# Altium footprint library Connectors.PcbLib: 408 footprints (part 4 of 26)
Each footprint in its own frame and in the unit in brackets; x right, y up, seen from the top. Pads: shape width x height; smd on the part's side, far side on the other; paste and mask are expansions set on the pad; w line width, h text height; cw(c..) or ccw(c..) is an arc to the next point about the centre after c.
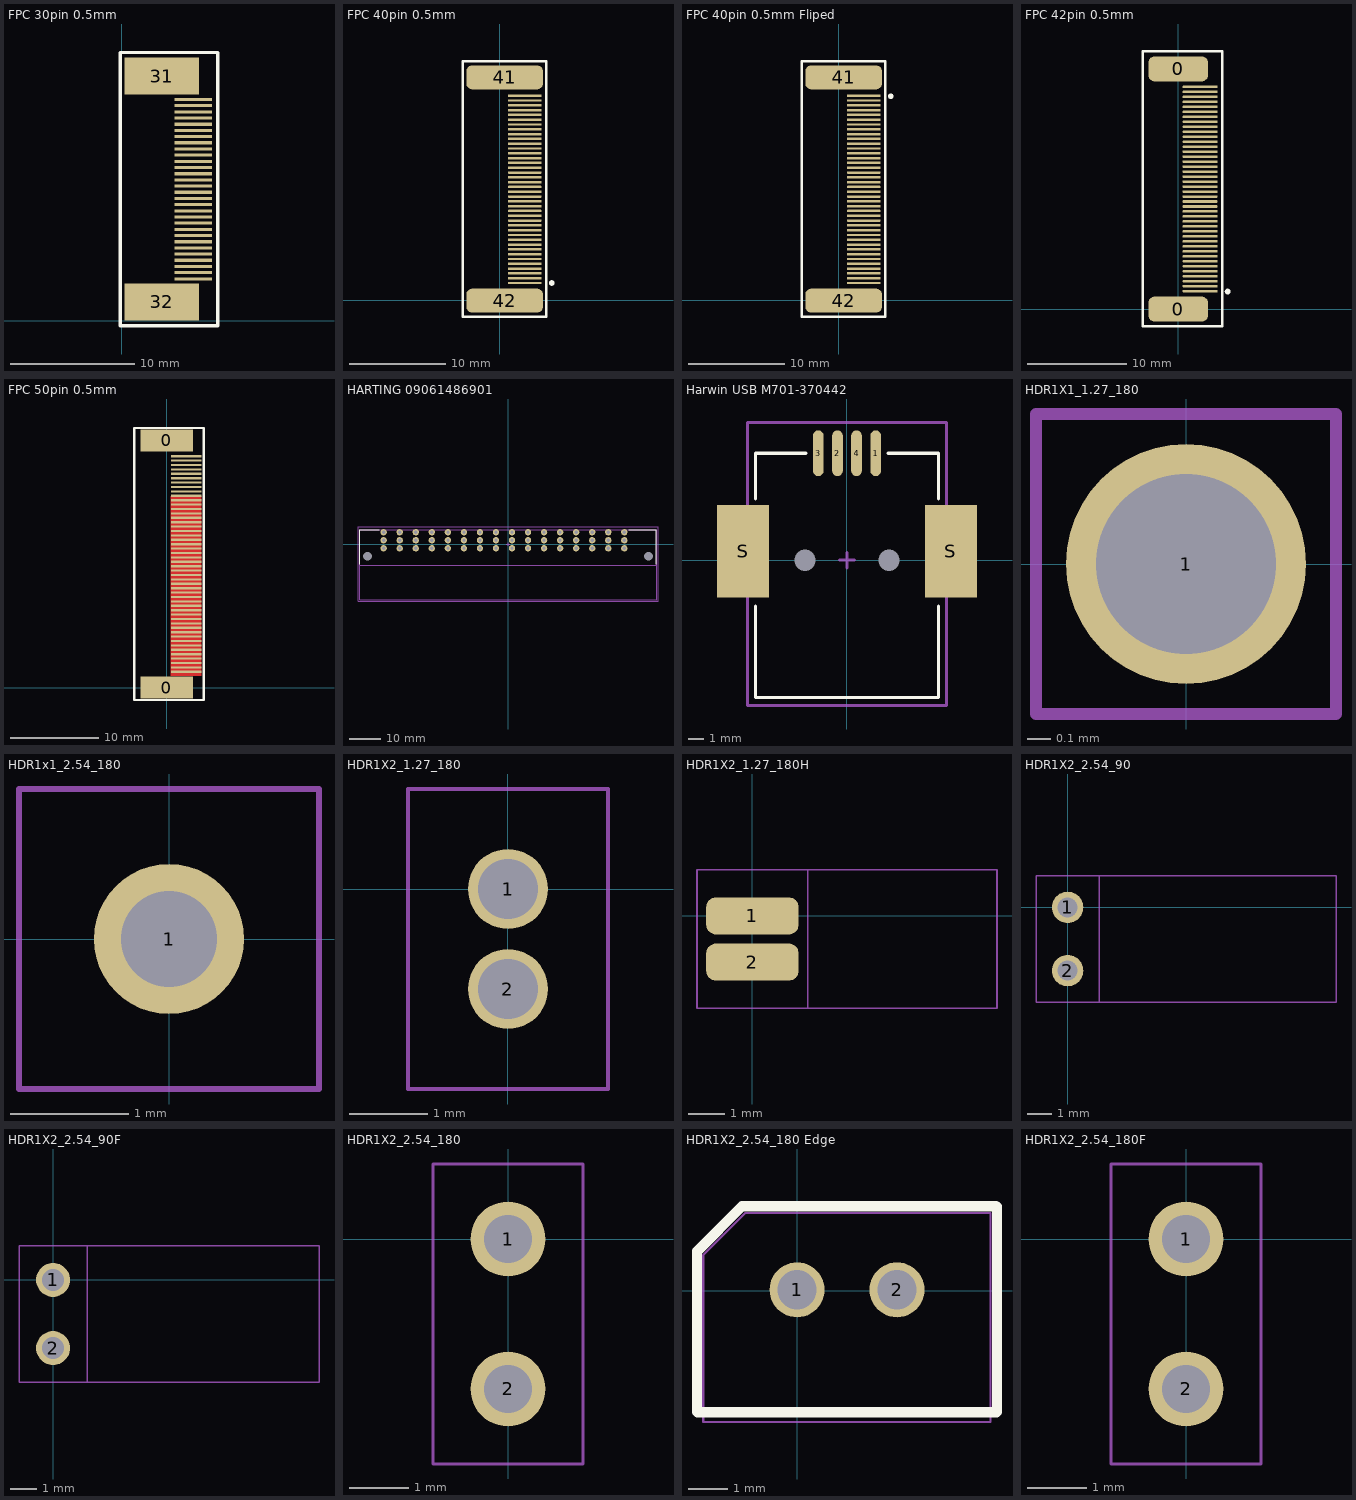
[diagram p3: the footprints below, top view; thin cyan lines are the x and y axes]

## FPC 30pin 0.5mm [mm] "FPC connector 24pin 0.5mm"
pads (32):
  rect 3x0.25 smd: 1(5.79,3.39) 2(5.79,3.89) 3(5.79,4.389) 4(5.79,4.889) 5(5.79,5.389) 6(5.79,5.888) 7(5.79,6.388) 8(5.79,6.888) 9(5.79,7.387) 10(5.79,7.887) 11(5.79,8.387) 12(5.79,8.886) 13(5.79,9.386) 14(5.79,9.885) 15(5.79,10.385) 16(5.79,10.885) 17(5.79,11.384) 18(5.79,11.884) 19(5.79,12.384) 20(5.79,12.883) 21(5.79,13.383) 22(5.79,13.883) 23(5.79,14.382) 24(5.79,14.882) 25(5.79,15.382) 26(5.79,15.881) 27(5.79,16.381) 28(5.79,16.881) 29(5.79,17.38) 30(5.79,17.88)
  rect 6x3 smd: 31(3.24,19.767) 32(3.24,1.53)
Top Overlay:
  lines w0.254: -0.11,-0.4 -0.11,21.677 7.762,21.677 7.762,-0.4 -0.11,-0.4
3D body "affc20-30-050-sht-r.stp": height 2.02, standoff -0.02, extent 0.821,0.385 6.221,20.885

## FPC 40pin 0.5mm [mm] "FPC connector 42pin 1mm"
pads (42):
  rrect50% 3.5x0.254 smd: 1(2.59,1.8) 2(2.59,2.3) 3(2.59,2.8) 4(2.59,3.3) 5(2.59,3.8) 6(2.59,4.3) 7(2.59,4.8) 8(2.59,5.3) 9(2.59,5.8) 10(2.59,6.3) 11(2.59,6.8) 12(2.59,7.3) 13(2.59,7.8) 14(2.59,8.3) 15(2.59,8.8) 16(2.59,9.3) 17(2.59,9.8) 18(2.59,10.3) 19(2.59,10.8) 20(2.59,11.3) 21(2.59,11.8) 22(2.59,12.3) 23(2.59,12.8) 24(2.59,13.3) 25(2.59,13.8) 26(2.59,14.3) 27(2.59,14.8) 28(2.59,15.3) 29(2.59,15.8) 30(2.59,16.3) 31(2.59,16.8) 32(2.59,17.3) 33(2.59,17.8) 34(2.59,18.3) 35(2.59,18.8) 36(2.59,19.3) 37(2.59,19.8) 38(2.59,20.3) 39(2.59,20.8) 40(2.59,21.3)
  rrect50% 8x2.5 smd: 41(0.5,23.202) 42(0.5,-0.03)
Top Overlay:
  circle w0.3: c5.4,1.8 r0.141
  lines w0.254: -3.85,-1.696 -3.85,24.863 4.85,24.863 4.85,-1.696 -3.85,-1.696
3D body "31805.stp": height 2.5, standoff -0.05, extent -3.398,-0.898 3.802,24.002

## FPC 40pin 0.5mm Fliped [mm] "FPC connector 42pin 1mm"
pads (42):
  rrect50% 3.5x0.254 smd: 1(2.59,21.3) 2(2.59,20.8) 3(2.59,20.3) 4(2.59,19.8) 5(2.59,19.3) 6(2.59,18.8) 7(2.59,18.3) 8(2.59,17.8) 9(2.59,17.3) 10(2.59,16.8) 11(2.59,16.3) 12(2.59,15.8) 13(2.59,15.3) 14(2.59,14.8) 15(2.59,14.3) 16(2.59,13.8) 17(2.59,13.3) 18(2.59,12.8) 19(2.59,12.3) 20(2.59,11.8) 21(2.59,11.3) 22(2.59,10.8) 23(2.59,10.3) 24(2.59,9.8) 25(2.59,9.3) 26(2.59,8.8) 27(2.59,8.3) 28(2.59,7.8) 29(2.59,7.3) 30(2.59,6.8) 31(2.59,6.3) 32(2.59,5.8) 33(2.59,5.3) 34(2.59,4.8) 35(2.59,4.3) 36(2.59,3.8) 37(2.59,3.3) 38(2.59,2.8) 39(2.59,2.3) 40(2.59,1.8)
  rrect50% 8x2.5 smd: 41(0.5,23.202) 42(0.5,-0.03)
Top Overlay:
  circle w0.3: c5.4,21.24 r0.141
  lines w0.254: -3.85,-1.696 -3.85,24.863 4.85,24.863 4.85,-1.696 -3.85,-1.696
3D body "31805.stp": height 2.5, standoff -0.05, extent -3.398,-0.898 3.802,24.002

## FPC 42pin 0.5mm [mm] "FPC connector 42pin 1mm"
pads (44):
  rrect50% 6x2.5 smd: 0(0,0) 0(0,24.11)
  rrect50% 3.5x0.254 smd: 1(2.2,1.8) 2(2.2,2.3) 3(2.2,2.8) 4(2.2,3.3) 5(2.2,3.8) 6(2.2,4.3) 7(2.2,4.8) 8(2.2,5.3) 9(2.2,5.8) 10(2.2,6.3) 11(2.2,6.8) 12(2.2,7.3) 13(2.2,7.8) 14(2.2,8.3) 15(2.2,8.8) 16(2.2,9.3) 17(2.2,9.8) 18(2.2,10.3) 19(2.2,10.8) 20(2.2,11.3) 21(2.2,11.8) 22(2.2,12.3) 23(2.2,12.8) 24(2.2,13.3) 25(2.2,13.8) 26(2.2,14.3) 27(2.2,14.8) 28(2.2,15.3) 29(2.2,15.8) 30(2.2,16.3) 31(2.2,16.8) 32(2.2,17.3) 33(2.2,17.8) 34(2.2,18.3) 35(2.2,18.8) 36(2.2,19.3) 37(2.2,19.8) 38(2.2,20.3) 39(2.2,20.8) 40(2.2,21.3) 41(2.2,21.8) 42(2.2,22.3)
Top Overlay:
  circle w0.3: c4.96,1.76 r0.141
  lines w0.254: -3.54,-1.71 -3.54,25.88 4.41,25.88 4.41,-1.71 -3.54,-1.71
3D body "4-1734839-2.stp": height 2.05, standoff 0, extent -2.535,-1.17 2.575,25.26

## FPC 50pin 0.5mm [mm] "FPC connector 50pin 0.5mm"
pads (52):
  rect 6x2.5 smd: 0(0,0) 0(0,28.1)
  rect 3.5x0.254 smd: 1(2.2,1.8) 2(2.2,2.3) 3(2.2,2.8) 4(2.2,3.3) 5(2.2,3.8) 6(2.2,4.3) 7(2.2,4.8) 8(2.2,5.3) 9(2.2,5.8) 10(2.2,6.3) 11(2.2,6.8) 12(2.2,7.3) 13(2.2,7.8) 14(2.2,8.3) 15(2.2,8.8) 16(2.2,9.3) 17(2.2,9.8) 18(2.2,10.3) 19(2.2,10.8) 20(2.2,11.3) 21(2.2,11.8) 22(2.2,12.3) 23(2.2,12.8) 24(2.2,13.3) 25(2.2,13.8) 26(2.2,14.3) 27(2.2,14.8) 28(2.2,15.3) 29(2.2,15.8) 30(2.2,16.3) 31(2.2,16.8) 32(2.2,17.3) 33(2.2,17.8) 34(2.2,18.3) 35(2.2,18.8) 36(2.2,19.3) 37(2.2,19.8) 38(2.2,20.3) 39(2.2,20.8) 40(2.2,21.3) 41(2.2,21.8) 42(2.2,22.3) 43(2.2,22.8) 44(2.2,23.3) 45(2.2,23.8) 46(2.2,24.3) 47(2.2,24.8) 48(2.2,25.3) 49(2.2,25.8) 50(2.2,26.3)
Top Layer:
  pour cut-out: 0.475,1.35 3.925,1.35 3.925,21.775 0.425,21.775
Top Overlay:
  lines w0.254: -3.7,-1.4 4.2,-1.4 4.2,29.5 -3.7,29.5 -3.7,-1.4
3D body "541045033.stp": height 2.06, standoff 0.01, extent -3.775,-1.2 3.375,29.3

## HARTING 09061486901 [mm]
height 11.25
pads (50):
  round 2 hole 1: B1(36.83,1.27) B2(31.75,1.27) B3(26.67,1.27) B4(21.59,1.27) B5(16.51,1.27) B6(11.43,1.27) B7(6.35,1.27) B8(1.27,1.27) B9(-3.81,1.27) B10(-8.89,1.27) B11(-13.97,1.27) B12(-19.05,1.27) B13(-24.13,1.27) B14(-29.21,1.27) B15(-34.29,1.27) B16(-39.37,1.27) D1(36.83,3.81) D2(31.75,3.81) D3(26.67,3.81) D4(21.59,3.81) D5(16.51,3.81) D6(11.43,3.81) D7(6.35,3.81) D8(1.27,3.81) D9(-3.81,3.81) D10(-8.89,3.81) D11(-13.97,3.81) D12(-19.05,3.81) D13(-24.13,3.81) D14(-29.21,3.81) D15(-34.29,3.81) D16(-39.37,3.81) Z1(36.83,-1.27) Z2(31.75,-1.27) Z3(26.67,-1.27) Z4(21.59,-1.27) Z5(16.51,-1.27) Z6(11.43,-1.27) Z7(6.35,-1.27) Z8(1.27,-1.27) Z9(-3.81,-1.27) Z10(-8.89,-1.27) Z11(-13.97,-1.27) Z12(-19.05,-1.27) Z13(-24.13,-1.27) Z14(-29.21,-1.27) Z15(-34.29,-1.27) Z16(-39.37,-1.27)
  round 0 hole 2.8 unplated: M(-44.45,-3.81) M(44.45,-3.81)
Top Overlay:
  lines w0.2: -46.99,-6.35 -46.99,4.6 -40.8,4.6 ; 38.3,4.6 46.99,4.6 46.99,-6.35
Mechanical 13:
  lines w0.2: -47,-6.57 -40.37,-6.57 41.23,-6.57 47,-6.57 ; -46.97,-17.51 -46.97,4.59 47.03,4.59 47.03,-17.51 -46.97,-17.51
Mechanical 15:
  lines w0.2: -0.5,0 0.5,0 ; 0,-0.5 0,0.5 ; -47.5,-18 47.5,-18 47.5,5.5 -47.5,5.5 -47.5,-18
3D body "Harting 09061486901.STEP": height 11.25, standoff -3.55, extent -46.97,-17.51 47.03,4.59

## Harwin USB M701-370442 [mm]
height 11
pads (8):
  oval 0.7x3 smd: 1(1.875,7) 2(-0.625,7) 3(-1.875,7) 4(0.625,7)
  rect 0x0 hole 1.4 unplated: M(-2.75,0) M(2.75,0)
  rect 3.4x6.04 smd: S(-6.8,0.58) S(6.8,0.58)
Top Overlay:
  lines w0.2: -6,-3 -6,-9 0,-9 6,-9 6,-3 ; -6,4 -6,7 -2.7,7 ; 2.7,7 6,7 6,4
Mechanical 15:
  lines w0.2: -0.5,0 0.5,0 ; 0,-0.5 0,0.5 ; -6.5,-9.5 0,-9.5 6.5,-9.5 6.5,9 0,9 -6.5,9 -6.5,-9.5
3D body "Harwin M701-370442.STEP": height 11, standoff -1.5, extent -8.1,-9 8.1,8.15

## HDR1X1_1.27_180 [mil]
height 169.29
pads (1):
  round 40 hole 30: 1(0,0)
Mechanical 13:
  lines w2: -25,-25 -25,25 25,25 25,-25 -25,-25
Mechanical 14:
  lines w2: -25,-25 25,-25 25,25 -25,25 -25,-25
  text "P1" at -20,-15 h50

## HDR1x1_2.54_180 [mil]
height 169.29
pads (1):
  round 50 hole 32: 1(0,0)
Mechanical 13:
  lines w2: -50,-50 50,-50 50,50 -50,50 -50,-50
Mechanical 14:
  lines w2: -50,-50 50,-50 50,50 -50,50 -50,-50
  text ".Designator" at -31,-20 h80

## HDR1X2_1.27_180 [mil]
height 169.29
pads (2):
  round 40 hole 30: 1(0,0) 2(0,-50)
Mechanical 13:
  lines w2: -50,-100 -50,50 50,50 50,-100 -50,-100
Mechanical 14:
  lines w2: -50,-100 -50,50 50,50 50,-100 -50,-100
  text ".Designator" at -31,-45 h80
3D body "pin_header_a-sl127-eg-g02d.stp": height 210.24, standoff -102.36, extent -49.21,-74.99 49.21,25.01

## HDR1X2_1.27_180H [mil]
height 169.29
pads (2):
  rrect50% 100x40 smd: 1(0,0) 2(0,-50)
Mechanical 13:
  lines w2: -60,-100 265,-100 265,50 -60,50 -60,-100
Mechanical 14:
  lines w2: -60,-100 60,-100 60,50 -60,50 -60,-100
  text ".Designator" at -31,-45 h80
3D body "pin_header_a-sl127-eg-g02d.stp": height 49.21, standoff -49.21, extent -47.36,-74.99 265.24,25.01

## HDR1X2_2.54_90 [mil]
height 169.29
pads (2):
  round 50 hole 32: 1(0,0) 2(0,-100)
Mechanical 13:
  lines w2: -50,-150 425,-150 425,50 -50,50 -50,-150
Mechanical 14:
  lines w2: -50,-150 -50,50 50,50 50,-150 -50,-150
  text ".Designator" at -31,-70 h80
3D body "pin_header_aw140-ea-g02g.stp": height 99.21, standoff -93.7, extent -15,-146.06 423.58,46.06

## HDR1X2_2.54_90F [mil]
height 169.29
pads (2):
  round 50 hole 32: 1(0,0) 2(0,-100)
Mechanical 13:
  lines w2: -50,-150 -50,50 390,50 390,-150 -50,-150
Mechanical 14:
  lines w2: -50,-150 -50,50 50,50 50,-150 -50,-150
  text ".Designator" at -31,-70 h80
3D body "female_header_a-bl254-ea-g02d.stp": height 99.21, standoff -125.2, extent -10,-154.92 386.06,54.92

## HDR1X2_2.54_180 [mil]
height 169.29
pads (2):
  round 50 hole 32: 1(0,0) 2(0,-100)
Mechanical 13:
  lines w2: -50,-150 50,-150 50,50 -50,50 -50,-150
Mechanical 14:
  lines w2: -50,-150 50,-150 50,50 -50,50 -50,-150
  text ".Designator" at -31,-70 h80
3D body "pin_header_aw140-eg-g02d.stp": height 322.83, standoff -118.11, extent -49.18,-150 49.18,50

## HDR1X2_2.54_180 Edge [mm]
height 4.3
pads (2):
  round 1.4 hole 1: 1(-0.006,0.021) 2(2.534,0.021)
Top Overlay:
  lines w0.254: -2.549,1.004 -1.405,2.148 -1.379,2.148 -0.004,2.148 5.053,2.148 ; -2.533,-3.101 -2.528,-3.096 -0.003,-3.096 5.067,-3.096 ; -2.545,-3.085 5.075,-3.085 5.075,2.14 -1.413,2.14 -2.545,0.994 -2.545,-3.085
Mechanical 13:
  lines w0.051: -2.379,-3.334 4.908,-3.334 4.908,1.97 -1.328,1.97 -2.379,0.919 -2.379,-3.334
Mechanical 14:
  lines w0.051: -2.392,-3.332 4.911,-3.332 4.911,1.974 -1.324,1.974 -2.392,0.906 -2.392,-3.332
3D body "JST B2B-XH-A.STEP": height 7, standoff -3.4, extent -2.426,-3.186 4.974,2.564

## HDR1X2_2.54_180F [mil]
height 169.29
pads (2):
  round 50 hole 32: 1(0,0) 2(0,-100)
Mechanical 13:
  lines w2: -50,-150 50,-150 50,50 -50,50 -50,-150
Mechanical 14:
  lines w2: -50,-150 -50,50 50,50 50,-150 -50,-150
  text ".Designator" at -31,-70 h80
3D body "female_header_a-bl254-eg-g02d.stp": height 334.65, standoff -125.98, extent -49.21,-154.92 49.22,54.92